# Altium footprint library Eis_Lib.PcbLib: 75 footprints (part 5 of 5)
Each footprint in its own frame and in the unit in brackets; x right, y up, seen from the top. Pads: shape width x height; smd on the part's side, far side on the other; paste and mask are expansions set on the pad; w line width, h text height; cw(c..) or ccw(c..) is an arc to the next point about the centre after c.
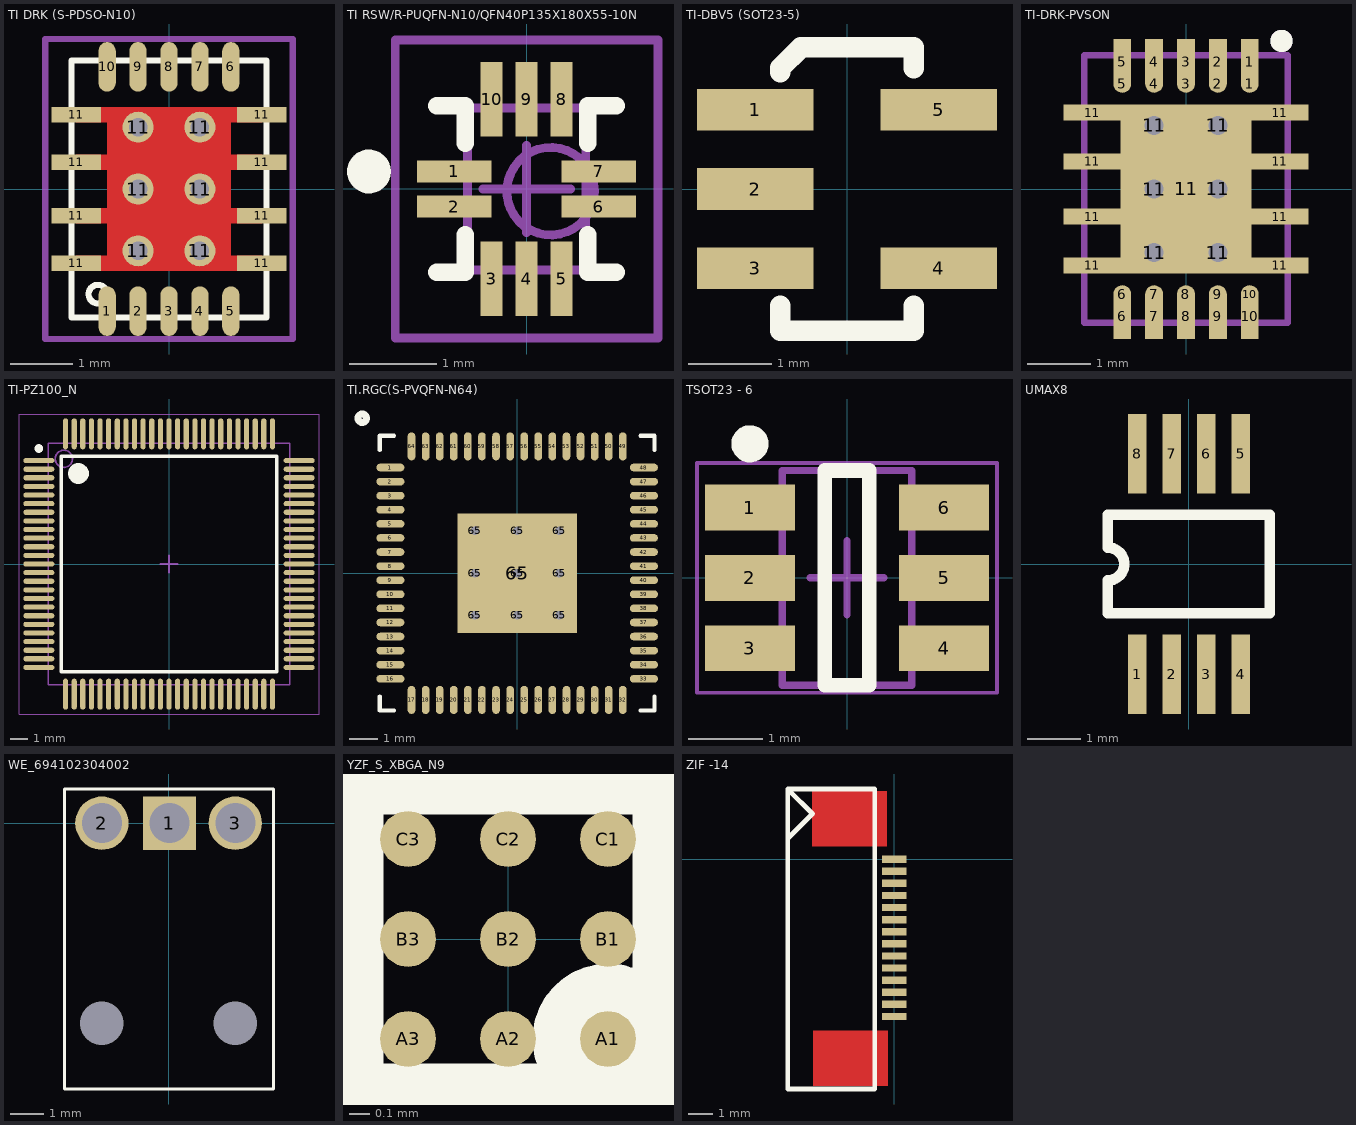
[diagram p4: the footprints below, top view; thin cyan lines are the x and y axes]

## TI DRK (S-PDSO-N10) [mm]
pads (24):
  oval 0.28x0.8 smd paste+0 mask+0.05: 1(-1,-1.975) 2(-0.5,-1.975) 3(0,-1.975) 4(0.5,-1.975) 5(1,-1.975) 6(1,1.975) 7(0.5,1.975) 8(0,1.975) 9(-0.5,1.975) 10(-1,1.975)
  rect 0.8x0.25 smd paste+0 mask+0: 11(-1.5,-1.2) 11(-1.5,-0.435) 11(-1.5,0.435) 11(-1.5,1.2) 11(1.5,-1.2) 11(1.5,-0.435) 11(1.5,0.435) 11(1.5,1.2)
  round 0.5 hole 0.3 paste-0.03 mask+0: 11(-0.5,-1) 11(-0.5,0) 11(-0.5,1) 11(0.5,-1) 11(0.5,0) 11(0.5,1)
Top Layer:
  rectangle: -1,-1.325 1,1.325
  rectangle: -1.5,1.075 1.5,1.325
  rectangle: -1.5,0.31 1.5,0.56
  rectangle: -1.5,-0.56 1.5,-0.31
  rectangle: -1.5,-1.325 1.5,-1.075
Top Overlay:
  circle w0.1: c-1.15,-1.7 r0.15
  lines w0.1: -1.575,-2.075 1.575,-2.075 1.575,2.075 -1.575,2.075 -1.575,-2.075
Top Paste:
  region: 0.9,1.2 0.1,1.2 0.1,0.1 0.9,0.1
  region: 0.9,-0.1 0.1,-0.1 0.1,-1.2 0.9,-1.2
  rectangle: -0.9,-1.2 -0.1,-0.1
  rectangle: -0.9,0.1 -0.1,1.2
Top Solder:
  rectangle: -1,-1.3 1,1.3
Mechanical 15:
  lines w0.1: -0.5,0 0.5,0 ; 0,-0.5 0,0.5 ; -2,-2.425 2,-2.425 2,2.425 -2,2.425 -2,-2.425
3D body: height 1, standoff 0, extent -1.625,-2.125 1.625,2.125

## TI RSW/R-PUQFN-N10/QFN40P135X180X55-10N [mm] "QFN, 10-Leads, Body 1,9x1,4mm (max), Pitch 0,40mm, IPC Medium Density"
height 0.55
pads (10):
  rect 0.85x0.25 smd: 1(-0.825,0.2) 2(-0.825,-0.2) 6(0.825,-0.2) 7(0.825,0.2)
  rect 0.25x0.85 smd: 3(-0.4,-1.025) 4(0,-1.025) 5(0.4,-1.025) 8(0.4,1.025) 9(0,1.025) 10(-0.4,1.025)
Top Overlay:
  circle w0.25: c-1.8,0.2 r0.125
  lines w0.2: -1.025,-0.95 -0.7,-0.95 -0.7,-0.525 ; -1.025,0.95 -0.7,0.95 -0.7,0.525 ; 0.7,-0.525 0.7,-0.95 1.025,-0.95 ; 0.7,0.525 0.7,0.95 1.025,0.95
Mechanical 13:
  circle w0.1: c0.275,-0.025 r0.5
  lines w0.1: -0.675,-0.925 0.675,-0.925 0.675,0.925 -0.675,0.925 -0.675,-0.925
Mechanical 15:
  lines w0.1: -0.5,0 0.5,0 ; 0,-0.5 0,0.5 ; -1.5,-1.7 1.5,-1.7 1.5,1.7 -1.5,1.7 -1.5,-1.7
3D body: height 0.55, standoff 0.05, extent -0.675,-0.925 0.675,0.925

## TI-DBV5 (SOT23-5) [mm]
pads (5):
  rect 1.4x0.5 smd: 1(-1.1,0.95) 2(-1.1,0) 3(-1.1,-0.95) 4(1.1,-0.95) 5(1.1,0.95)
Top Overlay:
  lines w0.249: -0.8,-1.4 -0.8,-1.699 0.8,-1.699 0.8,-1.4 ; -0.8,1.4 -0.8,1.45 -0.551,1.699 0.8,1.699 0.8,1.45
3D body: height 1.45, standoff 0, extent -0.925,-1.824 0.925,1.824

## TI-DRK-PVSON [mm] "RI DRK, 10+1-Leads, Body 4.15x3.15mm, Pitch 0.5mm"
height 1
pads (35):
  rect 0.28x0.71 smd: 1(1,2) 2(0.5,2) 3(0,2) 4(-0.5,2) 5(-1,2) 6(-1,-2) 7(-0.5,-2) 8(0,-2) 9(0.5,-2) 10(1,-2)
  round 0.28 smd: 1(1,1.65) 2(0.5,1.65) 3(0,1.65) 4(-0.5,1.65) 5(-1,1.65) 6(-1,-1.65) 7(-0.5,-1.65) 8(0,-1.65) 9(0.5,-1.65) 10(1,-1.65)
  rect 0.9x0.25 smd: 11(-1.475,-1.2) 11(-1.475,-0.435) 11(-1.475,0.435) 11(-1.475,1.2) 11(1.475,-1.2) 11(1.475,-0.435) 11(1.475,0.435) 11(1.475,1.2)
  round 0.6 hole 0.3: 11(-0.5,1) 11(-0.5,0) 11(-0.5,-1) 11(0.5,1) 11(0.5,0) 11(0.5,-1)
  rect 2.05x2.65 smd: 11(0,0)
Top Overlay:
  circle w0.3: c1.5,2.325 r0.025
Mechanical 13:
  circle w0.3: c1.5,2.325 r0.025
  lines w0.1: -1.6,-2.1 1.6,-2.1 1.6,2.1 -1.6,2.1 -1.6,-2.1
3D body: height 1, standoff 0, extent -1.6,-2.1 1.6,2.1

## TI-PZ100_N [mm] "QFP, 100-Leads, Body 14x14mm, Pitch 0.5mm, IPC Medium Density"
height 1.6
pads (100):
  oval 1.8x0.3 smd: 1(-7.55,6) 2(-7.55,5.5) 3(-7.55,5) 4(-7.55,4.5) 5(-7.55,4) 6(-7.55,3.5) 7(-7.55,3) 8(-7.55,2.5) 9(-7.55,2) 10(-7.55,1.5) 11(-7.55,1) 12(-7.55,0.5) 13(-7.55,0) 14(-7.55,-0.5) 15(-7.55,-1) 16(-7.55,-1.5) 17(-7.55,-2) 18(-7.55,-2.5) 19(-7.55,-3) 20(-7.55,-3.5) 21(-7.55,-4) 22(-7.55,-4.5) 23(-7.55,-5) 24(-7.55,-5.5) 25(-7.55,-6) 51(7.55,-6) 52(7.55,-5.5) 53(7.55,-5) 54(7.55,-4.5) 55(7.55,-4) 56(7.55,-3.5) 57(7.55,-3) 58(7.55,-2.5) 59(7.55,-2) 60(7.55,-1.5) 61(7.55,-1) 62(7.55,-0.5) 63(7.55,0) 64(7.55,0.5) 65(7.55,1) 66(7.55,1.5) 67(7.55,2) 68(7.55,2.5) 69(7.55,3) 70(7.55,3.5) 71(7.55,4) 72(7.55,4.5) 73(7.55,5) 74(7.55,5.5) 75(7.55,6)
  oval 0.3x1.8 smd: 26(-6,-7.55) 27(-5.5,-7.55) 28(-5,-7.55) 29(-4.5,-7.55) 30(-4,-7.55) 31(-3.5,-7.55) 32(-3,-7.55) 33(-2.5,-7.55) 34(-2,-7.55) 35(-1.5,-7.55) 36(-1,-7.55) 37(-0.5,-7.55) 38(0,-7.55) 39(0.5,-7.55) 40(1,-7.55) 41(1.5,-7.55) 42(2,-7.55) 43(2.5,-7.55) 44(3,-7.55) 45(3.5,-7.55) 46(4,-7.55) 47(4.5,-7.55) 48(5,-7.55) 49(5.5,-7.55) 50(6,-7.55) 76(6,7.55) 77(5.5,7.55) 78(5,7.55) 79(4.5,7.55) 80(4,7.55) 81(3.5,7.55) 82(3,7.55) 83(2.5,7.55) 84(2,7.55) 85(1.5,7.55) 86(1,7.55) 87(0.5,7.55) 88(0,7.55) 89(-0.5,7.55) 90(-1,7.55) 91(-1.5,7.55) 92(-2,7.55) 93(-2.5,7.55) 94(-3,7.55) 95(-3.5,7.55) 96(-4,7.55) 97(-4.5,7.55) 98(-5,7.55) 99(-5.5,7.55) 100(-6,7.55)
Top Overlay:
  circle w0.6: c-5.25,5.25 r0.3
  circle w0.25: c-7.55,6.7 r0.125
  lines w0.2: -6.25,-6.25 6.25,-6.25 6.25,6.25 -6.25,6.25 -6.25,-6.25
Mechanical 13:
  circle w0.1: c-6.1,6.1 r0.5
  lines w0.1: -7,-7 7,-7 7,7 -7,7 -7,-7
Mechanical 15:
  lines w0.05: -8.7,-8.7 8.7,-8.7 8.7,8.7 -8.7,8.7 -8.7,-8.7
  lines w0.1: -0.5,0 0.5,0 ; 0,-0.5 0,0.5
3D body: height 1.6, standoff 0.05, extent -7,-7 7,7

## TI.RGC(S-PVQFN-N64) [mm]
pads (74):
  oval 1x0.27 smd: 1(-4.5,3.75) 2(-4.5,3.25) 3(-4.5,2.75) 4(-4.5,2.25) 5(-4.5,1.75) 6(-4.5,1.25) 7(-4.5,0.75) 8(-4.5,0.25) 9(-4.5,-0.25) 10(-4.5,-0.75) 11(-4.5,-1.25) 12(-4.5,-1.75) 13(-4.5,-2.25) 14(-4.5,-2.75) 15(-4.5,-3.25) 16(-4.5,-3.75) 33(4.5,-3.75) 34(4.5,-3.25) 35(4.5,-2.75) 36(4.5,-2.25) 37(4.5,-1.75) 38(4.5,-1.25) 39(4.5,-0.75) 40(4.5,-0.25) 41(4.5,0.25) 42(4.5,0.75) 43(4.5,1.25) 44(4.5,1.75) 45(4.5,2.25) 46(4.5,2.75) 47(4.5,3.25) 48(4.5,3.75)
  oval 0.27x1 smd: 17(-3.75,-4.5) 18(-3.25,-4.5) 19(-2.75,-4.5) 20(-2.25,-4.5) 21(-1.75,-4.5) 22(-1.25,-4.5) 23(-0.75,-4.5) 24(-0.25,-4.5) 25(0.25,-4.5) 26(0.75,-4.5) 27(1.25,-4.5) 28(1.75,-4.5) 29(2.25,-4.5) 30(2.75,-4.5) 31(3.25,-4.5) 32(3.75,-4.5) 49(3.75,4.5) 50(3.25,4.5) 51(2.75,4.5) 52(2.25,4.5) 53(1.75,4.5) 54(1.25,4.5) 55(0.75,4.5) 56(0.25,4.5) 57(-0.25,4.5) 58(-0.75,4.5) 59(-1.25,4.5) 60(-1.75,4.5) 61(-2.25,4.5) 62(-2.75,4.5) 63(-3.25,4.5) 64(-3.75,4.5)
  round 0.6 hole 0.3: 65(-1.5,-1.5) 65(-1.5,0) 65(-1.5,1.5) 65(0,-1.5) 65(0,0) 65(0,1.5) 65(1.5,-1.5) 65(1.5,0) 65(1.5,1.5)
  rect 4.25x4.25 smd paste-25 mask+0: 65(0,0)
Top Overlay:
  circle w0.25: c-5.5,5.5 r0.15
  lines w0.15: -4.875,-4.375 -4.875,-4.875 -4.375,-4.875 ; -4.875,4.375 -4.875,4.875 -4.375,4.875 ; 4.375,-4.875 4.825,-4.875 ; 4.375,4.875 4.875,4.875 4.875,4.375 ; 4.875,-4.875 4.875,-4.375
3D body: height 0.87, standoff 0, extent -4.5,-4.5 4.5,4.5

## TSOT23 - 6 [mm] "Spannung Wandler LTC3459ES6"
height 1
pads (6):
  rect 1.22x0.62 smd mask+0.05: 1(-1.31,0.95) 2(-1.31,0) 3(-1.31,-0.95) 4(1.31,-0.95) 5(1.31,0) 6(1.31,0.95)
Top Overlay:
  circle w0.25: c-1.31,1.81 r0.125
  lines w0.2: -0.3,-1.45 0.3,-1.45 0.3,1.45 -0.3,1.45 -0.3,-1.45
Mechanical 13:
  lines w0.1: -0.875,-1.45 -0.875,1.45 0.875,1.45 0.875,-1.45 -0.875,-1.45
Mechanical 15:
  lines w0.05: -2.025,-1.55 -2.025,1.55 2.025,1.55 2.025,-1.55 -2.025,-1.55
  lines w0.1: -0.5,0 0.5,0 ; 0,-0.5 0,0.5
3D body: height 1, standoff 0.01, extent -0.875,-1.45 0.875,1.45

## UMAX8 [mm] "Shrink Small Outline; 8 Leads; Body Width 3 mm; Pitch 0.65 mm"
height 1.1
pads (8):
  rect 0.35x1.5 smd: 1(-0.975,-2.075) 2(-0.325,-2.075) 3(0.325,-2.075) 4(0.975,-2.075) 5(0.975,2.075) 6(0.325,2.075) 7(-0.325,2.075) 8(-0.975,2.075)
Top Overlay:
  lines w0.2: -1.525,-0.925 1.525,-0.925 1.525,0.925 -1.525,0.925 -1.525,0.308 cw(c-1.525,0) -1.525,-0.308 -1.525,-0.925
3D body: height 1.1, standoff 0, extent -1.526,-0.925 1.525,0.925

## WE_694102304002 [mm] "Connector WE 694102304002, Body 6,3 x 5 x 9"
height 1.6
pads (5):
  round 0 hole 1.3 unplated: 0(-2,-6) 0(2,-6)
  rect 1.6x1.6 hole 1.2: 1(0.025,0)
  round 1.6 hole 1.2: 2(-2,0) 3(2,0)
Top Overlay:
  lines w0.1: -3.125,-7.975 -3.125,1.025 3.15,1.025 3.15,-7.975 -3.125,-7.975
3D body: height 5, standoff -3.05, extent -3.15,-7.975 3.15,1.025

## YZF_S_XBGA_N9 [mil] "DSBGA9 1.62x1.58mm 9-Pin"
pads (9):
  round 11 smd mask+0: A1(19.68,-19.68) A2(0,-19.68) A3(-19.68,-19.68) B1(19.68,0) B2(0,0) B3(-19.68,0) C1(19.68,19.68) C2(0,19.68) C3(-19.68,19.68)
Top Overlay:
  circle w10: c19.68,-19.68 r9.84
  lines w10: -29.53,-29.53 29.53,-29.53 29.53,29.53 -29.53,29.53 -29.53,-29.53
3D body: height 23.62, standoff 3.94, extent -34.53,-34.53 34.53,34.53
3D body: height 24.61, standoff 0, extent -29.51,-29.51 29.51,29.51

## ZIF -14 [mm]
height 2
pads (14):
  rect 1x0.3 smd: 1(0,0) 2(0,-0.5) 3(0,-1) 4(0,-1.5) 5(0,-2) 6(0,-2.5) 7(0,-3) 8(0,-3.5) 9(0,-4) 10(0,-4.5) 11(0,-5) 12(0,-5.5) 13(0,-6) 14(0,-6.5)
Top Layer:
  rectangle: -3.4,0.52 -0.3,2.82
  rectangle: -3.35,-9.375 -0.25,-7.075
Top Overlay:
  lines w0.2: -4.4,-9.5 -4.4,2.9 -0.8,2.9 -0.8,-9.5 -4.375,-9.5 ; -4.375,0.875 -3.375,1.875 -4.375,2.875
3D body: height 2.01, standoff 0.01, extent -5,-9.7 0.3,3.2